# Altium footprint library AMMDK_Parts.PcbLib: 25 footprints (part 2 of 2)
Each footprint in its own frame and in the unit in brackets; x right, y up, seen from the top. Pads: shape width x height; smd on the part's side, far side on the other; paste and mask are expansions set on the pad; w line width, h text height; cw(c..) or ccw(c..) is an arc to the next point about the centre after c.
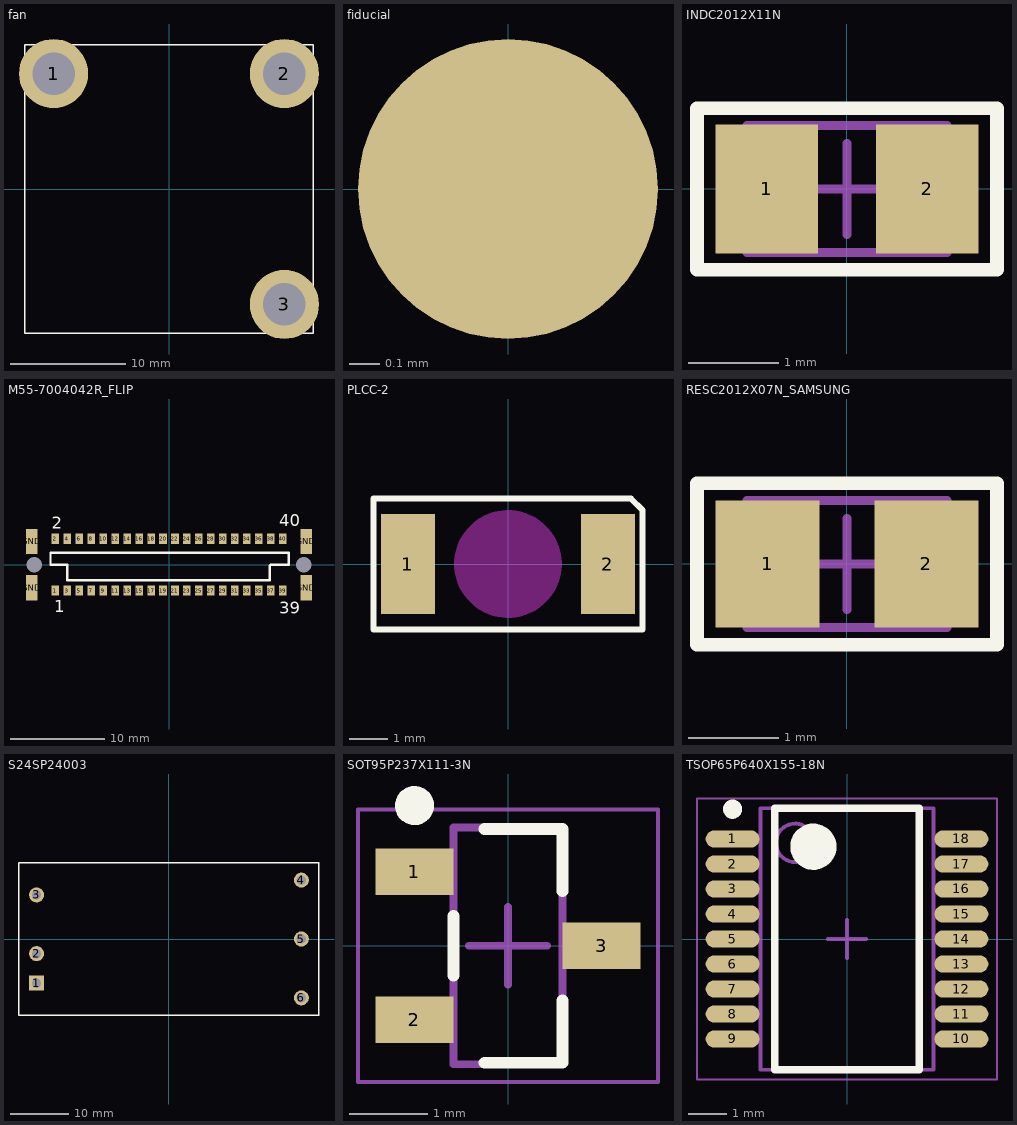
[diagram p1: the footprints below, top view; thin cyan lines are the x and y axes]

## fan [mm] "25mm fan"
height 18
pads (3):
  round 6 / inner round 0 / far side round 0 hole 3.7 unplated: 1(-10,10) 2(10,10) 3(10,-10)
Top Overlay:
  lines w0.152: -12.5,-12.5 12.5,-12.5 12.5,12.5 -12.5,12.5 -12.5,-12.5
3D body "fan.sldprt": height 18.12, standoff 8, extent -12.55,-12.55 12.55,12.55
3D body "9774080151r.sldprt": height 8, standoff -1.4, extent 7.45,-12.547 12.55,-7.453
3D body "9774080151r.sldprt": height 8, standoff -1.4, extent 7.45,7.453 12.55,12.547
3D body "9774080151r.sldprt": height 8, standoff -1.4, extent -12.55,7.453 -7.45,12.547

## fiducial [mm]
pads (1):
  round 1 smd paste-1 mask+1: ""(0,0)

## INDC2012X11N [mm] "Chip Inductor, 2-Leads, Body 2.00x1.20mm, IPC Medium Density"
height 1.1
pads (2):
  rect 1.13x1.42 smd: 1(-0.885,0) 2(0.885,0)
Top Overlay:
  lines w0.152: -1.651,-0.889 1.651,-0.889 1.651,0.889 -1.651,0.889 -1.651,-0.889
Mechanical 13:
  lines w0.1: -1.1,-0.7 1.1,-0.7 1.1,0.7 -1.1,0.7 -1.1,-0.7
Mechanical 15:
  lines w0.1: -0.5,0 0.5,0 ; 0,-0.5 0,0.5
3D body: height 1.1, standoff 0, extent 0.6,-0.7 1.1,0.7
3D body: height 1.1, standoff 0, extent -1.1,-0.7 -0.6,0.7
3D body: height 1.1, standoff 0, extent -0.6,-0.7 0.6,0.7

## M55-7004042R_FLIP [mm] "M55-7004042R"
height 6.75
pads (46):
  rect 0.8x1.1 smd: 1(-12.065,-2.75) 2(-12.065,2.75) 3(-10.795,-2.75) 4(-10.795,2.75) 5(-9.525,-2.75) 6(-9.525,2.75) 7(-8.255,-2.75) 8(-8.255,2.75) 9(-6.985,-2.75) 10(-6.985,2.75) 11(-5.715,-2.75) 12(-5.715,2.75) 13(-4.445,-2.75) 14(-4.445,2.75) 15(-3.175,-2.75) 16(-3.175,2.75) 17(-1.905,-2.75) 18(-1.905,2.75) 19(-0.635,-2.75) 20(-0.635,2.75) 21(0.635,-2.75) 22(0.635,2.75) 23(1.905,-2.75) 24(1.905,2.75) 25(3.175,-2.75) 26(3.175,2.75) 27(4.445,-2.75) 28(4.445,2.75) 29(5.715,-2.75) 30(5.715,2.75) 31(6.985,-2.75) 32(6.985,2.75) 33(8.255,-2.75) 34(8.255,2.75) 35(9.525,-2.75) 36(9.525,2.75) 37(10.795,-2.75) 38(10.795,2.75) 39(12.065,-2.75) 40(12.065,2.75)
  rect 1.2x2.7 smd: GND(-14.56,-2.45) GND(-14.56,2.45) GND(14.56,-2.45) GND(14.56,2.45)
  round 0 hole 1.65 unplated: ""(-14.275,0) ""(14.275,0)
Top Overlay:
  lines w0.254: -12.573,0 -10.795,0 -10.795,-1.651 10.668,-1.651 10.668,-0.127 10.795,0 12.7,0 12.7,1.27 -12.573,1.27 -12.573,0
  text "40" at 11.684,4.064 h1.27
  text "1" at -12.192,-5.08 h1.27
  text "2" at -12.446,3.81 h1.27
  text "39" at 11.684,-5.207 h1.27
3D body "m55-7004042_asm.stp": height 6.75, standoff -0.75, extent -15.24,-3.6 15.24,3.6

## PLCC-2 [mm] "Reverse gullwing LED"
pads (2):
  rect 1.4x2.6 smd paste-10: 1(-2.6,0) 2(2.6,0)
Top Overlay:
  lines w0.152: -3.5,-1.7 -3.5,1.7 3.2,1.7 3.5,1.4 3.5,-1.7 -3.5,-1.7
Top Solder:
  circle w1.6: c0,0 r0.8
Keep-Out Layer:
  circle w1.6: c0,0 r0.6
3D body "xzdgk45wt-9.sldprt": height 1.87, standoff 0, extent -2.58,-1.4 2.62,1.4

## RESC2012X07N_SAMSUNG [mm] "Chip Resistor, 2-Leads, Body 2.00x1.25mm, IPC Medium Density"
height 0.65
pads (2):
  rect 1.15x1.4 smd: 1(-0.875,0) 2(0.875,0)
Top Overlay:
  lines w0.152: -1.651,-0.889 1.651,-0.889 1.651,0.889 -1.651,0.889 -1.651,-0.889
Mechanical 13:
  lines w0.1: -1.1,-0.7 1.1,-0.7 1.1,0.7 -1.1,0.7 -1.1,-0.7
Mechanical 15:
  lines w0.1: -0.5,0 0.5,0 ; 0,-0.5 0,0.5
3D body "RESC2012X07N_0-OHM-JMP.step": height 0.65, standoff 0, extent -1.1,-0.7 1.1,0.7

## S24SP24003 [mm]
pads (6):
  rect 2.6x2.6 hole 1.6: 1(-22.86,-7.62)
  round 2.6 hole 1.6: 2(-22.86,-2.54) 3(-22.86,7.62) 4(22.86,10.16) 5(22.86,0) 6(22.86,-10.16)
Top Overlay:
  lines w0.254: -25.9,-13.208 25.908,-13.208 ; -25.9,-13.2 -25.9,13.2 ; -25.9,13.208 25.908,13.208 ; 25.9,-13.2 25.9,13.2
3D body: height 10.5, standoff 0, extent -25.4,-12.7 25.4,12.7

## SOT95P237X111-3N [mm] "SOT23, 3-Leads, Body 2.92x2.37mm, Pitch 0.95mm, IPC Medium Density"
height 1.11
pads (3):
  rect 1x0.6 smd: 1(-1.2,0.95) 2(-1.2,-0.95) 3(1.2,0)
Top Overlay:
  circle w0.25: c-1.2,1.8 r0.125
  lines w0.152: -0.7,-0.381 -0.7,0.381 ; -0.3,-1.5 0.7,-1.5 0.7,-0.7 ; -0.3,1.5 0.7,1.5 0.7,0.7
Mechanical 13:
  lines w0.1: -0.7,-1.52 0.7,-1.52 0.7,1.52 -0.7,1.52 -0.7,-1.52
Mechanical 15:
  lines w0.05: -1.925,-1.75 -1.925,1.75 1.925,1.75 1.925,-1.75 -1.925,-1.75
  lines w0.1: -0.5,0 0.5,0 ; 0,-0.5 0,0.5
3D body: height 1.11, standoff 0.01, extent -0.7,-1.52 0.7,1.52

## TSOP65P640X155-18N [mm] "TSOP, 18-Leads, Body 6.60x4.40mm, Pitch 0.65mm, IPC Medium Density"
height 1.55
pads (18):
  oval 1.4x0.45 smd: 1(-2.975,2.6) 2(-2.975,1.95) 3(-2.975,1.3) 4(-2.975,0.65) 5(-2.975,0) 6(-2.975,-0.65) 7(-2.975,-1.3) 8(-2.975,-1.95) 9(-2.975,-2.6) 10(2.975,-2.6) 11(2.975,-1.95) 12(2.975,-1.3) 13(2.975,-0.65) 14(2.975,0) 15(2.975,0.65) 16(2.975,1.3) 17(2.975,1.95) 18(2.975,2.6)
Top Overlay:
  circle w0.25: c-2.975,3.375 r0.125
  circle w0.6: c-0.875,2.4 r0.3
  lines w0.2: -1.875,-3.4 -1.875,3.4 1.875,3.4 1.875,-3.4 -1.875,-3.4
Mechanical 13:
  circle w0.1: c-1.35,2.5 r0.5
  lines w0.1: -2.25,-3.4 -2.25,3.4 2.25,3.4 2.25,-3.4 -2.25,-3.4
Mechanical 15:
  lines w0.05: -3.9,-3.65 -3.9,3.65 3.9,3.65 3.9,-3.65 -3.9,-3.65
  lines w0.1: -0.5,0 0.5,0 ; 0,-0.5 0,0.5
3D body "TSOP65P640X155-18N.step": height 1.55, standoff 0, extent -3.2,-3.4 3.2,3.4